# Altium footprint library Airscout_PCB_LibV2.0.PcbLib: 50 footprints (part 2 of 4)
Each footprint in its own frame and in the unit in brackets; x right, y up, seen from the top. Pads: shape width x height; smd on the part's side, far side on the other; paste and mask are expansions set on the pad; w line width, h text height; cw(c..) or ccw(c..) is an arc to the next point about the centre after c.
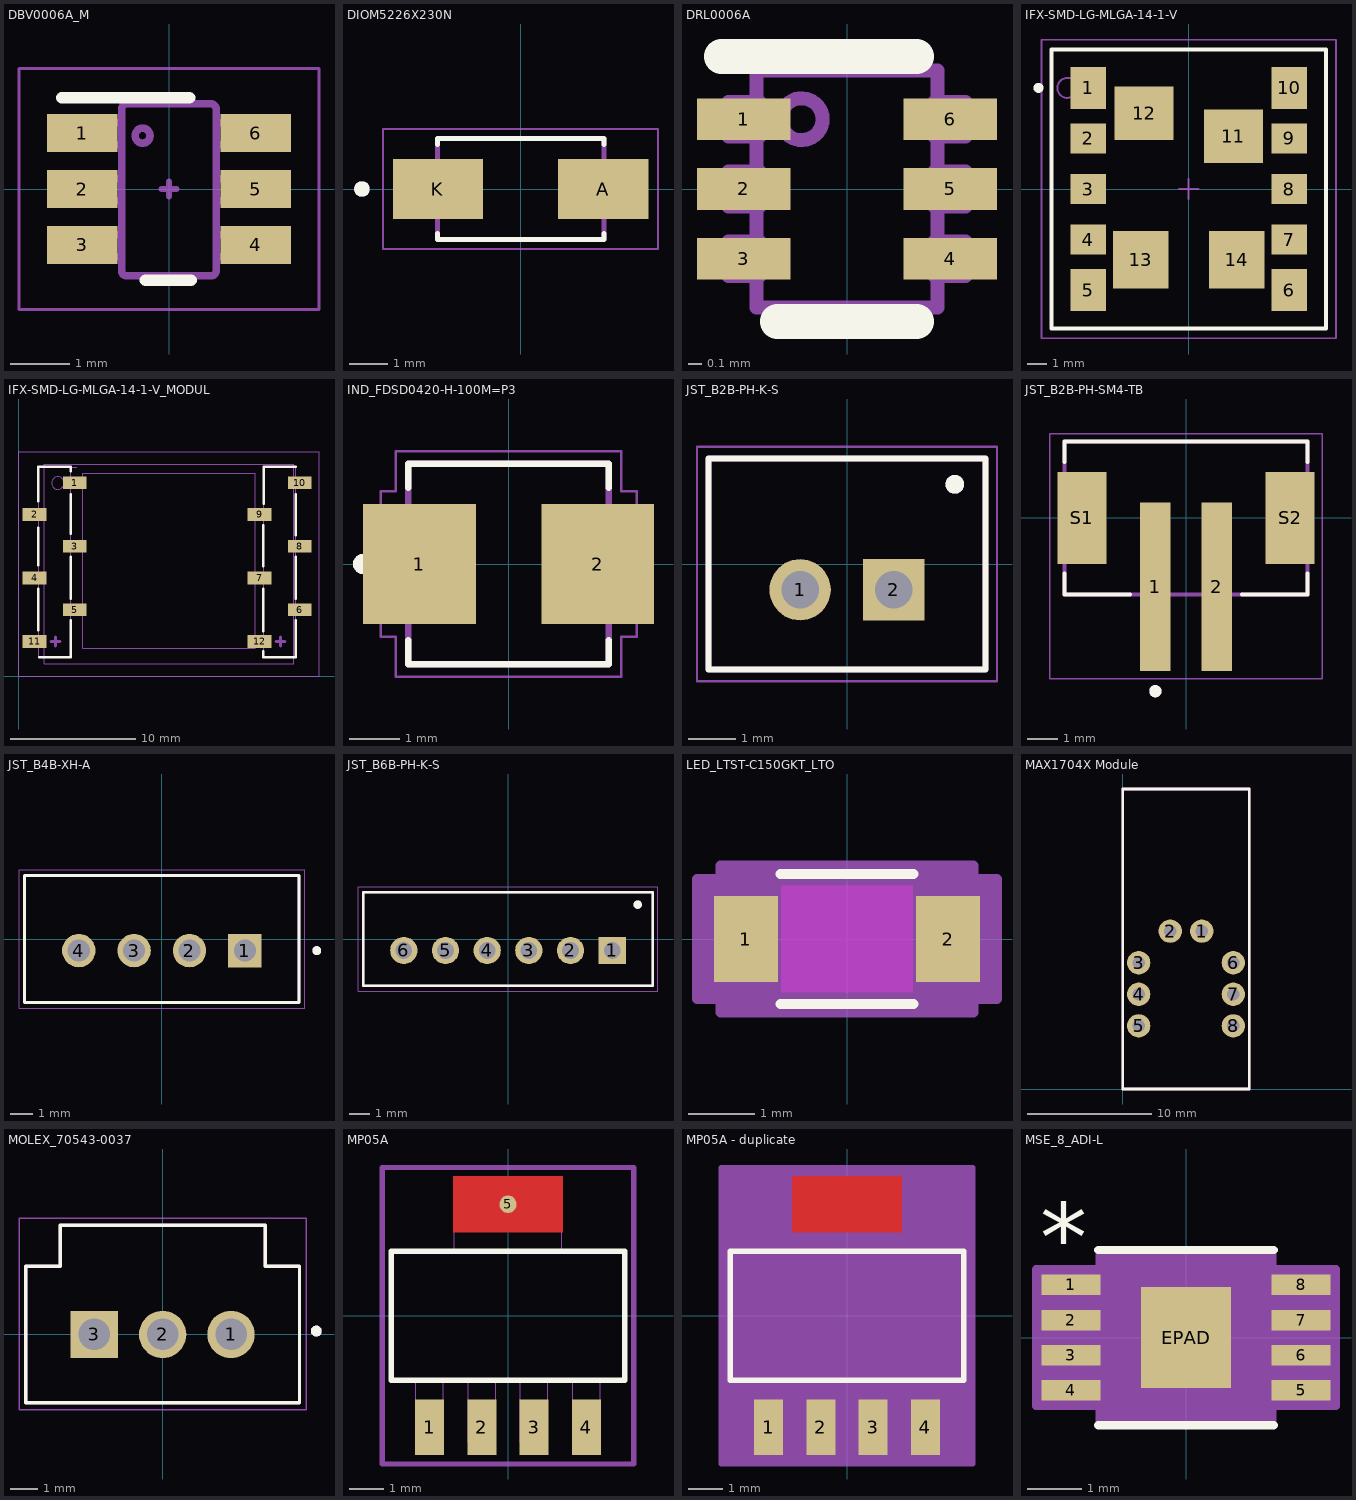
[diagram p1: the footprints below, top view; thin cyan lines are the x and y axes]

## DBV0006A_M [mm]
pads (6):
  rect 1.2x0.65 smd paste+0 mask+0.051: 1(-1.475,0.95) 2(-1.475,0) 3(-1.475,-0.95) 4(1.475,-0.95) 5(1.475,0) 6(1.475,0.95)
Top Overlay:
  lines w0.2: -1.825,1.55 0.35,1.55 ; -0.4,-1.55 0.375,-1.55
Mechanical 13:
  lines w0.127: 0.724,-1.475 ccw(c0.723,-1.399) 0.8,-1.399 0.8,1.37 ccw(c0.723,1.37) 0.724,1.446 ; 0.723,-1.475 -0.724,-1.475 -0.725,-1.475 cw(c-0.724,-1.399) -0.801,-1.399 -0.801,1.37 cw(c-0.724,1.37) -0.725,1.446 -0.724,1.446 0.723,1.446 ; 0.723,-1.475 0.724,-1.475 ; 0.723,1.446 0.724,1.446 ; -1.423,-1.154 -1.423,-0.78 -1.206,-0.78 -1.113,-0.78 -1.081,-0.78 -0.828,-0.78 -0.801,-0.78 -0.801,-1.154 -0.828,-1.154 -1.081,-1.154 -1.113,-1.154 -1.206,-1.154 -1.423,-1.154 ; -1.423,-0.202 -1.423,0.173 -1.206,0.173 -1.113,0.173 -1.081,0.173 -0.828,0.173 -0.801,0.173 -0.801,-0.202 -0.828,-0.202 -1.081,-0.202 -1.113,-0.202 -1.206,-0.202 -1.423,-0.202 ; -1.423,0.751 -1.423,1.125 -1.206,1.125 -1.113,1.125 -1.081,1.125 -0.828,1.125 -0.801,1.125 -0.801,0.751 -0.828,0.751 -1.081,0.751 -1.113,0.751 -1.206,0.751 -1.423,0.751 ; -0.577,0.906 ccw(c-0.45,0.906) -0.323,0.906 ccw(c-0.45,0.906) -0.577,0.906 ; 0.8,-1.154 0.8,-0.78 0.827,-0.78 1.08,-0.78 1.112,-0.78 1.205,-0.78 1.422,-0.78 1.422,-1.154 1.205,-1.154 1.112,-1.154 1.08,-1.154 0.827,-1.154 0.8,-1.154 ; 0.8,-0.202 0.8,0.173 0.827,0.173 1.08,0.173 1.112,0.173 1.205,0.173 1.422,0.173 1.422,-0.202 1.205,-0.202 1.112,-0.202 1.08,-0.202 0.827,-0.202 0.8,-0.202 ; 0.8,0.751 0.8,1.125 0.827,1.125 1.08,1.125 1.112,1.125 1.205,1.125 1.422,1.125 1.422,0.751 1.205,0.751 1.112,0.751 1.08,0.751 0.827,0.751 0.8,0.751
Mechanical 15:
  lines w0.05: -2.55,-2.05 -2.55,2.05 2.55,2.05 2.55,-2.05 -2.55,-2.05
  lines w0.1: -0.127,0 0.127,0 ; 0,-0.127 0,0.127
3D body "DBV0006A.stp": height 1.2, standoff 0, extent -1.4,-1.45 1.4,1.45

## DIOM5226X230N [mm]
height 2.3
pads (2):
  rect 2.33x1.55 smd: A(2.135,0) K(-2.135,0)
Top Overlay:
  circle w0.2: c-4.1,0 r0.1
  lines w0.127: -2.15,-1.15 -2.15,-1.302 2.15,-1.302 2.15,-1.15 ; -2.15,1.15 -2.15,1.302 2.15,1.302 2.15,1.15
Mechanical 13:
  circle w0.2: c-4.1,0 r0.1
  lines w0.127: -2.15,-1.302 2.15,-1.302 2.15,1.302 -2.15,1.302 -2.15,-1.302
Mechanical 15:
  lines w0.05: -3.55,-1.552 3.55,-1.552 3.55,1.552 -3.55,1.552 -3.55,-1.552
3D body "step_temp.STEP": height 2.4, standoff 0, extent -2.598,-1.302 2.598,1.302

## DRL0006A [mm]
pads (6):
  rect 0.67x0.3 smd paste+0 mask+0: 1(-0.74,0.5) 2(-0.74,0) 3(-0.74,-0.5) 4(0.74,-0.5) 5(0.74,0) 6(0.74,0.5)
Top Overlay:
  lines w0.25: -0.9,0.95 0.5,0.95 ; -0.5,-0.95 0.5,-0.95
Mechanical 13:
  circle w0.1: c-0.325,0.5 r0.15
  lines w0.1: -0.65,-0.625 -0.65,-0.85 0.65,-0.85 0.65,-0.625 ; -0.65,-0.375 -0.65,-0.125 ; -0.65,0.125 -0.65,0.375 ; -0.65,0.625 -0.65,0.85 0.65,0.85 0.65,0.625 ; 0.65,-0.375 0.65,0.375 ; -0.85,-0.625 -0.627,-0.625 -0.627,-0.375 -0.85,-0.375 -0.85,-0.625 ; -0.85,-0.125 -0.85,0.125 -0.627,0.125 -0.627,-0.125 -0.85,-0.125 ; -0.85,0.375 -0.627,0.375 -0.627,0.625 -0.85,0.625 -0.85,0.375 ; 0.627,-0.625 0.85,-0.625 0.85,-0.375 0.627,-0.375 0.627,-0.625 ; 0.627,-0.125 0.627,0.125 0.85,0.125 0.85,-0.125 0.627,-0.125 ; 0.627,0.375 0.85,0.375 0.85,0.625 0.627,0.625 0.627,0.375
3D body "DRL0006A.stp": height 0.6, standoff 0, extent -0.8,-0.783 0.8,0.783

## IFX-SMD-LG-MLGA-14-1-V [mm] "Module, 2.54 mm Pitch, 14 Pin, 14.00 mm W X 13.80 mm L X 7.68 mm H Body"
height 7.68
pads (14):
  rect 1.8x2.1 smd paste-0.9 mask+0: 1(-5.05,5.08) 5(-5.05,-5.08) 6(5.05,-5.08) 10(5.05,5.08)
  rect 1.8x1.5 smd paste-0.9 mask+0: 2(-5.05,2.54) 3(-5.05,0) 4(-5.05,-2.54) 7(5.05,-2.54) 8(5.05,0) 9(5.05,2.54)
  rect 2.95x2.7 smd paste-1.475 mask+0: 11(2.245,2.655) 12(-2.245,3.805)
  rect 2.8x2.9 smd paste-1.4 mask+0: 13(-2.415,-3.55) 14(2.415,-3.55)
Top Overlay:
  circle w0.25: c-7.55,5.08 r0.125
  lines w0.2: -6.9,-7 6.9,-7 6.9,7 -6.9,7 -6.9,-7
Top Paste:
  region: -5.7,-4.155 -5.7,-6.005 -4.2,-6.005 -4.2,-4.155
  region: -5.7,-1.89 -5.7,-3.19 -4.2,-3.19 -4.2,-1.89
  region: -5.7,0.65 -5.7,-0.65 -4.2,-0.65 -4.2,0.65
  region: -5.7,3.19 -5.7,1.89 -4.2,1.89 -4.2,3.19
  region: -5.7,6.005 -5.7,4.155 -4.2,4.155 -4.2,6.005
  region: 4.2,6.005 4.2,4.155 5.7,4.155 5.7,6.005
  region: 4.2,3.19 4.2,1.89 5.7,1.89 5.7,3.19
  region: 4.2,0.65 4.2,-0.65 5.7,-0.65 5.7,0.65
  region: 4.2,-1.89 4.2,-3.19 5.7,-3.19 5.7,-1.89
  region: 4.2,-4.155 4.2,-6.005 5.7,-6.005 5.7,-4.155
  region: 2.345,3.855 2.345,2.755 3.555,2.755 3.555,3.855
  region: 2.345,2.555 2.345,1.455 3.555,1.455 3.555,2.555
  region: 0.935,3.855 0.935,2.755 2.145,2.755 2.145,3.855
  region: 0.935,2.555 0.935,1.455 2.145,1.455 2.145,2.555
  region: -2.145,5.005 -2.145,3.905 -0.935,3.905 -0.935,5.005
  region: -2.145,3.705 -2.145,2.605 -0.935,2.605 -0.935,3.705
  region: -3.555,5.005 -3.555,3.905 -2.345,3.905 -2.345,5.005
  region: -3.555,3.705 -3.555,2.605 -2.345,2.605 -2.345,3.705
  region: 2.515,-2.29 2.515,-3.45 3.675,-3.45 3.675,-2.29
  region: 2.515,-3.65 2.515,-4.81 3.675,-4.81 3.675,-3.65
  region: 1.155,-2.29 1.155,-3.45 2.315,-3.45 2.315,-2.29
  region: 1.155,-3.65 1.155,-4.81 2.315,-4.81 2.315,-3.65
  region: -2.315,-2.29 -2.315,-3.45 -1.155,-3.45 -1.155,-2.29
  region: -2.315,-3.65 -2.315,-4.81 -1.155,-4.81 -1.155,-3.65
  region: -3.675,-2.29 -3.675,-3.45 -2.515,-3.45 -2.515,-2.29
  region: -3.675,-3.65 -3.675,-4.81 -2.515,-4.81 -2.515,-3.65
Mechanical 3:
  text ".DESIGNATOR" at -3.643,-0.385 h1.2
Mechanical 13:
  circle w0.1: c-6.1,5.08 r0.5
  lines w0.1: -6.9,-7 -6.9,7 6.9,7 6.9,-7 -6.9,-7
Mechanical 15:
  lines w0.1: -0.5,0 0.5,0 ; 0,-0.5 0,0.5 ; -7.4,-7.5 7.4,-7.5 7.4,7.5 -7.4,7.5 -7.4,-7.5
3D body "LG-MLGA-14-1_Z8B00206105_V09_3D.stp": height 7.68, standoff 0, extent -6.9,-7 6.9,7

## IFX-SMD-LG-MLGA-14-1-V_MODUL [mm] "Module, 2.54 mm Pitch, 14 Pin, 14.00 mm W X 13.80 mm L X 7.68 mm H Body"
height 7.68
pads (12):
  rect 1.905x1.02 smd: 1(4.455,15.5) 2(1.25,12.96) 3(4.455,10.42) 4(1.25,7.88) 5(4.455,5.34) 6(22.455,5.34) 7(19.25,7.88) 8(22.455,10.42) 9(19.25,12.96) 10(22.455,15.5) 11(1.25,2.8) 12(19.25,2.8)
Top Overlay:
  lines w0.2: 1.552,3.7 1.552,7 ; 1.552,8.9 1.552,11.9 ; 1.552,14 1.552,16.77 4.122,16.77 4.122,16.4 ; 1.607,1.555 4.147,1.555 4.147,4.505 ; 4.152,6.2 4.152,9.6 ; 4.152,11.4 4.152,14.6 ; 19.552,2 19.552,1.53 22.122,1.53 22.122,4.48 ; 19.552,3.6 19.552,7 ; 19.552,8.8 19.552,12.1 ; 19.582,13.82 19.582,16.77 22.122,16.77 ; 22.152,6.2 22.152,9.6 ; 22.152,11.3 22.152,14.6
Mechanical 1:
  circle w0.1: c3.102,15.475 r0.5
Mechanical 7:
  lines w0.254: 2.561,2.8 3.291,2.8 ; 2.926,2.435 2.926,3.165 ; 20.561,2.8 21.291,2.8 ; 20.926,2.435 20.926,3.165
Mechanical 13:
  lines w0.1: 1.582,16.75 1.582,1.53 4.122,1.53 4.122,16.75 ; 2.082,16.75 4.622,16.75 ; 2,1 2,17 22,17 22,1 2,1 ; 5.1,2.275 5.1,16.275 18.9,16.275 18.9,2.275 5.1,2.275 ; 19.582,1.53 19.582,16.77 22.122,16.77 22.122,1.53 19.582,1.53
Mechanical 15:
  lines w0.1: 0,0 2,0 24,0 24,18 0,18 0,0 ; 0,0 0,0
3D body "NPPC061KFXC-RC--3DModel-STEP-740413.STEP": height 7.49, standoff 0, extent 0.775,1.524 5.067,16.764
3D body "NPPC061KFXC-RC--3DModel-STEP-740413.STEP": height 7.49, standoff 0, extent 18.669,1.524 22.962,16.764
3D body "LG-MLGA-14-1_Z8B00206105_V09_3D.stp": height 15.3, standoff 7.62, extent 5.1,2.275 18.9,16.275

## IND_FDSD0420-H-100M=P3 [mm]
pads (2):
  rect 2.25x2.4 smd: 1(-1.778,0) 2(1.778,0)
Top Overlay:
  circle w0.2: c-2.9,0 r0.1
  lines w0.127: -2,-1.52 -2,-2 2,-2 2,-1.52 ; -2,1.52 -2,2 2,2 2,1.52
Mechanical 13:
  circle w0.2: c-2.9,0 r0.1
  lines w0.127: -2,-2 2,-2 2,2 -2,2 -2,-2
Mechanical 15:
  lines w0.05: -2.55,-1.45 -2.55,1.45 -2.25,1.45 -2.25,2.25 2.25,2.25 2.25,1.45 2.55,1.45 2.55,-1.45 2.25,-1.45 2.25,-2.25 -2.25,-2.25 -2.25,-1.45 -2.55,-1.45
3D body "FDSD0420-H-100M=P3.STEP": height 2, standoff 0, extent -2,-2 2,2

## JST_B2B-PH-K-S [mm]
pads (2):
  round 1.308 hole 0.8: 1(-1,-0.55)
  rect 1.308x1.308 hole 0.8: 2(1,-0.55)
Top Overlay:
  circle w0.2: c2.3,1.7 r0.1
  lines w0.127: -2.95,-2.25 -2.95,2.25 2.95,2.25 2.95,-2.25 -2.95,-2.25
Mechanical 13:
  circle w0.2: c2.3,1.7 r0.1
  lines w0.127: -2.95,-2.25 2.95,-2.25 2.95,2.25 -2.95,2.25 -2.95,-2.25
Mechanical 15:
  lines w0.05: -3.2,-2.5 3.2,-2.5 3.2,2.5 -3.2,2.5 -3.2,-2.5
3D body "step_temp.STEP": height 6, standoff -3.4, extent -2.95,-2.25 2.95,2.25

## JST_B2B-PH-SM4-TB [mm]
height 6.6
pads (4):
  rect 1x5.5 smd: 1(-1,-2.25) 2(1,-2.25)
  rect 1.6x3 smd: S1(-3.4,0) S2(3.4,0)
Top Overlay:
  circle w0.2: c-1,-5.66 r0.1
  lines w0.127: -3.975,-1.82 -3.975,-2.5 -1.82,-2.5 ; -3.975,1.82 -3.975,2.5 3.975,2.5 3.975,1.82 ; 1.82,-2.5 3.975,-2.5 3.975,-1.82
Mechanical 13:
  circle w0.2: c-1,-5.66 r0.1
  lines w0.127: -3.975,-2.5 -3.975,2.5 3.975,2.5 3.975,-2.5 -3.975,-2.5
Mechanical 15:
  lines w0.05: -4.45,-5.25 4.45,-5.25 4.45,2.75 -4.45,2.75 -4.45,-5.25
3D body "step_temp.STEP": height 6.75, standoff 0, extent -3.975,-4.5 3.975,2.5

## JST_B4B-XH-A [mm]
height 7
pads (4):
  rect 1.508x1.508 / inner round 1.508 / far side rect 1.508x1.508 hole 1: 1(3.75,-0.525)
  round 1.508 hole 1: 2(1.25,-0.525) 3(-1.25,-0.525) 4(-3.75,-0.525)
Top Overlay:
  circle w0.2: c7,-0.525 r0.1
  lines w0.127: -6.2,-2.875 6.2,-2.875 6.2,2.875 -6.2,2.875 -6.2,-2.875
Mechanical 13:
  circle w0.2: c7,-0.525 r0.1
  lines w0.127: -6.2,-2.875 6.2,-2.875 6.2,2.875 -6.2,2.875 -6.2,-2.875
Mechanical 15:
  lines w0.05: -6.45,-3.125 6.45,-3.125 6.45,3.125 -6.45,3.125 -6.45,-3.125
3D body "step_temp.STEP": height 7, standoff -3.4, extent -6.2,-2.875 6.2,2.875

## JST_B6B-PH-K-S [mm]
pads (6):
  rect 1.308x1.308 hole 0.8: 1(5,-0.55)
  round 1.308 hole 0.8: 2(3,-0.55) 3(1,-0.55) 4(-1,-0.55) 5(-3,-0.55) 6(-5,-0.55)
Top Overlay:
  circle w0.2: c6.223,1.651 r0.1
  lines w0.127: -6.95,-2.25 6.95,-2.25 6.95,2.25 -6.95,2.25 -6.95,-2.25
Mechanical 13:
  circle w0.2: c6.223,1.651 r0.1
  lines w0.127: -6.95,-2.25 -6.95,2.25 6.95,2.25 6.95,-2.25 -6.95,-2.25
Mechanical 15:
  lines w0.05: -7.2,-2.5 -7.2,2.5 7.2,2.5 7.2,-2.5 -7.2,-2.5
3D body "step_temp.STEP": height 6, standoff -3.4, extent -6.95,-2.25 6.95,2.25

## LED_LTST-C150GKT_LTO [mil]
pads (2):
  rect 38x51 smd paste+0 mask+0: 1(-60,0) 2(60,0)
Top Layer keep-out:
  region: -39,-31.5 -39,31.5 39,31.5 39,-31.5
Top Overlay:
  lines w6: -39.38,-38.5 39.38,-38.5 ; -39.38,38.5 39.38,38.5
Keep-Out Layer:
  region: -39,-31.5 -39,31.5 39,31.5 39,-31.5
Mechanical 13:
  lines w1: -65,-33.5 65,-33.5 65,33.5 -65,33.5 -65,-33.5 ; -65,-25.5 -65,25.5 -65,-25.5 ; 65,-25.5 65,25.5 65,-25.5
Mechanical 15:
  region: -75,-35.5 -89,-35.5 -89,35.5 -75,35.5 -75,43.5 75,43.5 75,35.5 89,35.5 89,-35.5 75,-35.5 75,-43.5 -75,-43.5
  lines w6: -89,-35.5 -89,35.5 -75,35.5 -75,43.5 75,43.5 75,35.5 89,35.5 89,-35.5 75,-35.5 75,-43.5 -75,-43.5 -75,-35.5 -89,-35.5
3D body "LED_LTST-C150GKT_LTO.step": height 47.09, standoff 0, extent -65,-33.5 65,33.5

## MAX1704X Module [mil] "Breakout Board"
pads (8):
  round 74 hole 40: 1(250,500) 2(150,500) 3(50,400) 4(50,300) 5(50,200) 6(350,400) 7(350,300) 8(350,200)
Top Overlay:
  lines w8: 0,0 400,0 400,950 0,950 0,0
Mechanical 15:
  lines w8: 0,0 400,0 400,950 0,950 0,0

## MOLEX_70543-0037 [mm]
height 11.81
pads (3):
  round 1.755 hole 1.17: 1(2.54,0) 2(0,0)
  rect 1.755x1.755 hole 1.17: 3(-2.54,0)
Top Overlay:
  circle w0.2: c5.708,0.127 r0.1
  lines w0.127: -5.085,-2.54 5.085,-2.54 5.085,2.54 3.81,2.54 3.81,4.06 -3.81,4.06 -3.81,2.54 -5.085,2.54 -5.085,-2.54
Mechanical 13:
  circle w0.2: c5.708,0.127 r0.1
  lines w0.127: -5.085,-2.54 5.085,-2.54 5.085,2.54 3.81,2.54 3.81,4.06 -3.81,4.06 -3.81,2.54 -5.085,2.54 -5.085,-2.54
Mechanical 15:
  lines w0.05: -5.335,-2.79 -5.335,4.31 5.335,4.31 5.335,-2.79 -5.335,-2.79
3D body "705430037--3DModel-STEP-510211.STEP": height 11.81, standoff -3.3, extent -5.08,-2.54 5.08,4.064

## MP05A [mil]
pads (5):
  rect 33x63 smd paste-31.5 mask-31.5: 1(-88.58,-126) 2(-29.53,-126) 3(29.53,-126) 4(88.58,-126)
  round 19.68 smd mask+4: 5(0,125.98)
Top Layer:
  region: 62,94.5 62,157.5 -62,157.5 -62,94.5
  region: 62,94.5 62,157.5 -62,157.5 -62,94.5
Top Overlay:
  lines w6: -132,-73 132,-73 132,73 -132,73 -132,-73
Top Solder:
  region: 66.93,80.5 66.93,171.5 -66.93,171.5 -66.93,80.5
Mechanical 13:
  lines w1: -132,-73 132,-73 132,73 -132,73 -132,-73 ; -104.08,-143.5 -104.08,-73 -73.08,-73 -73.08,-143.5 -104.08,-143.5 ; -61,73 61,73 61,143.5 -61,143.5 -61,73 ; -45.03,-143.5 -45.03,-73 -14.03,-73 -14.03,-143.5 -45.03,-143.5 ; 14.03,-143.5 14.03,-73 45.03,-73 45.03,-143.5 14.03,-143.5 ; 73.08,-143.5 73.08,-73 104.08,-73 104.08,-143.5 73.08,-143.5
Mechanical 15:
  lines w6: -142,-167.5 -142,167.5 142,167.5 142,-167.5 -142,-167.5
3D body "MP05A.step": height 71.1, standoff 0, extent -132.01,-143.5 132.01,143.5

## MP05A - duplicate [mil]
pads (4):
  rect 33x63 smd paste-31.5 mask-31.5: 1(-88.58,-126) 2(-29.53,-126) 3(29.53,-126) 4(88.58,-126)
Top Layer:
  region: 62,94.5 62,157.5 -62,157.5 -62,94.5
Top Overlay:
  lines w6: -132,-73 -132,73 132,73 132,-73 -132,-73
Top Paste:
  region: 62,94.5 62,157.5 -62,157.5 -62,94.5
Top Solder:
  region: 63,80.5 63,171.5 -63,171.5 -63,80.5
Mechanical 13:
  lines w1: -132,-73 -132,73 132,73 132,-73 -132,-73 ; -104.08,-143.5 -73.08,-143.5 -73.08,-73 -104.08,-73 -104.08,-143.5 ; -61,73 -61,143.5 61,143.5 61,73 -61,73 ; -45.03,-143.5 -14.03,-143.5 -14.03,-73 -45.03,-73 -45.03,-143.5 ; 14.03,-143.5 45.03,-143.5 45.03,-73 14.03,-73 14.03,-143.5 ; 73.08,-143.5 104.08,-143.5 104.08,-73 73.08,-73 73.08,-143.5
Mechanical 15:
  region: 142,-167.5 -142,-167.5 -142,167.5 142,167.5
  lines w6: -142,-167.5 142,-167.5 142,167.5 -142,167.5 -142,-167.5
3D body "MP05A.step": height 71.1, standoff 0, extent -132.01,-143.5 132.01,143.5

## MSE_8_ADI-L [mil]
pads (9):
  rect 43x15 smd paste+0 mask+0: 1(-84,38.39) 2(-84,12.8) 3(-84,-12.8) 4(-84,-38.39) 5(84,-38.39) 6(84,-12.8) 7(84,12.8) 8(84,38.39)
  rect 66x74 smd paste+0 mask+0: EPAD(0,0)
Top Overlay:
  lines w6: -64,-64 64,-64 ; -64,64 64,64
  text "*" at -106.5,48.39 h50
Mechanical 13:
  lines w0: -12,59 ccw(c0,59) 12,59
  lines w1: -99.5,-45.89 -99.5,-30.89 -59,-30.89 -59,-45.89 -99.5,-45.89 ; -99.5,-20.3 -99.5,-5.3 -59,-5.3 -59,-20.3 -99.5,-20.3 ; -99.5,5.3 -99.5,20.3 -59,20.3 -59,5.3 -99.5,5.3 ; -99.5,30.89 -99.5,45.89 -59,45.89 -59,30.89 -99.5,30.89 ; -59,-59 59,-59 59,59 -59,59 -59,-59 ; 59,-45.89 59,-30.89 99.5,-30.89 99.5,-45.89 59,-45.89 ; 59,-20.3 59,-5.3 99.5,-5.3 99.5,-20.3 59,-20.3 ; 59,5.3 59,20.3 99.5,20.3 99.5,5.3 59,5.3 ; 59,30.89 59,45.89 99.5,45.89 99.5,30.89 59,30.89
  text "*" at -106.3,47.24 h50
Mechanical 15:
  region: -63,-49.89 -109.5,-49.89 -109.5,49.89 -63,49.89 -63,63 63,63 63,49.89 109.5,49.89 109.5,-49.89 63,-49.89 63,-63 -63,-63
  lines w6: -109.5,-49.89 -109.5,49.89 -63,49.89 -63,63 63,63 63,49.89 109.5,49.89 109.5,-49.89 63,-49.89 63,-63 -63,-63 -63,-49.89 -109.5,-49.89
3D body "MSE_8_ADI.step": height 43.11, standoff -2.01, extent -99.49,-59.02 99.49,59.02